# Altium footprint library mobinbyn-Header.PcbLib: 297 footprints (part 15 of 23)
Each footprint in its own frame and in the unit in brackets; x right, y up, seen from the top. Pads: shape width x height; smd on the part's side, far side on the other; paste and mask are expansions set on the pad; w line width, h text height; cw(c..) or ccw(c..) is an arc to the next point about the centre after c.
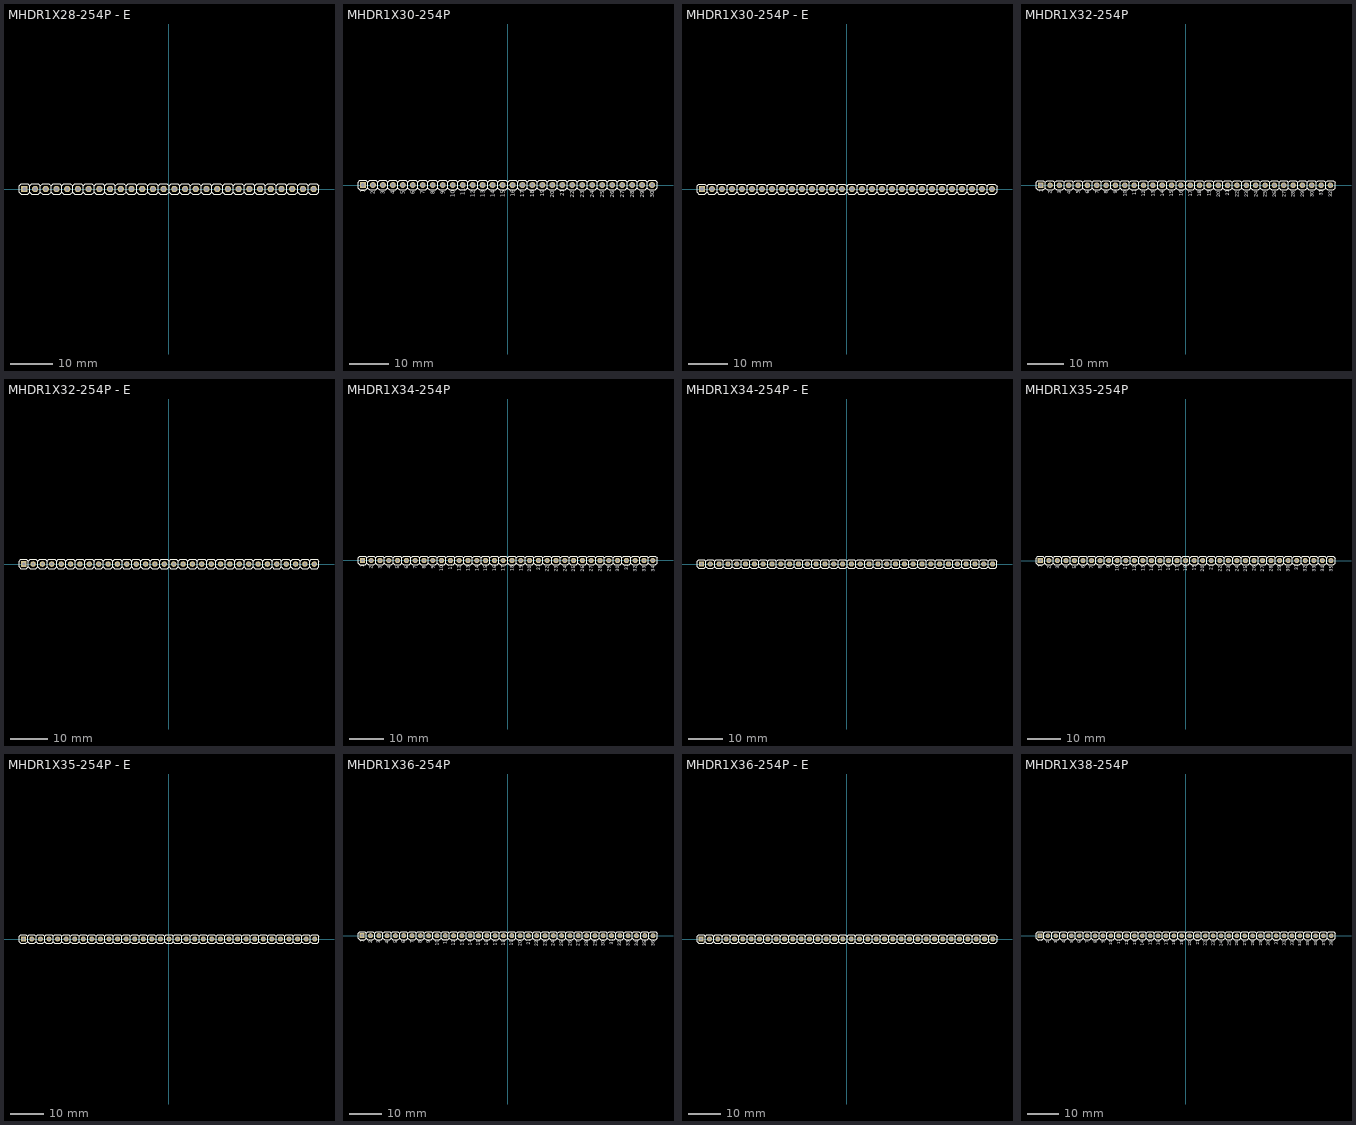
[diagram p14: the footprints below, top view; thin cyan lines are the x and y axes]

## MHDR1X28-254P - E [mm] "Male Header 1X28 with 2.54 mm Pitch"
height 8.4
pads (28):
  rect 1.5x1.5 hole 0.9: 1(-34.29,0)
  round 1.5 hole 0.9: 2(-31.75,0) 3(-29.21,0) 4(-26.67,0) 5(-24.13,0) 6(-21.59,0) 7(-19.05,0) 8(-16.51,0) 9(-13.97,0) 10(-11.43,0) 11(-8.89,0) 12(-6.35,0) 13(-3.81,0) 14(-1.27,0) 15(1.27,0) 16(3.81,0) 17(6.35,0) 18(8.89,0) 19(11.43,0) 20(13.97,0) 21(16.51,0) 22(19.05,0) 23(21.59,0) 24(24.13,0) 25(26.67,0) 26(29.21,0) 27(31.75,0) 28(34.29,0)
Top Overlay:
  drawing of 197 lines, arcs and shapes, not listed
3D body "PIN.STEP": height 8.43, standoff -2.49, extent -35.56,-1.27 -33.02,1.27
3D body "PIN_mid.STEP": height 8.43, standoff -2.49, extent -33.02,-1.27 -30.48,1.27
3D body "PIN_mid.STEP": height 8.43, standoff -2.49, extent -30.48,-1.27 -27.94,1.27
3D body "PIN_mid.STEP": height 8.43, standoff -2.49, extent -27.94,-1.27 -25.4,1.27
3D body "PIN_mid.STEP": height 8.43, standoff -2.49, extent -25.4,-1.27 -22.86,1.27
3D body "PIN_mid.STEP": height 8.43, standoff -2.49, extent -22.86,-1.27 -20.32,1.27
3D body "PIN_mid.STEP": height 8.43, standoff -2.49, extent -20.32,-1.27 -17.78,1.27
3D body "PIN_mid.STEP": height 8.43, standoff -2.49, extent -17.78,-1.27 -15.24,1.27
3D body "PIN_mid.STEP": height 8.43, standoff -2.49, extent -15.24,-1.27 -12.7,1.27
3D body "PIN_mid.STEP": height 8.43, standoff -2.49, extent -12.7,-1.27 -10.16,1.27
3D body "PIN_mid.STEP": height 8.43, standoff -2.49, extent -10.16,-1.27 -7.62,1.27
3D body "PIN_mid.STEP": height 8.43, standoff -2.49, extent -7.62,-1.27 -5.08,1.27
3D body "PIN_mid.STEP": height 8.43, standoff -2.49, extent -5.08,-1.27 -2.54,1.27
3D body "PIN_mid.STEP": height 8.43, standoff -2.49, extent -2.54,-1.27 0,1.27
3D body "PIN_mid.STEP": height 8.43, standoff -2.49, extent 0,-1.27 2.54,1.27
3D body "PIN_mid.STEP": height 8.43, standoff -2.49, extent 2.54,-1.27 5.08,1.27
3D body "PIN_mid.STEP": height 8.43, standoff -2.49, extent 5.08,-1.27 7.62,1.27
3D body "PIN_mid.STEP": height 8.43, standoff -2.49, extent 7.62,-1.27 10.16,1.27
3D body "PIN_mid.STEP": height 8.43, standoff -2.49, extent 10.16,-1.27 12.7,1.27
3D body "PIN_mid.STEP": height 8.43, standoff -2.49, extent 12.7,-1.27 15.24,1.27
3D body "PIN_mid.STEP": height 8.43, standoff -2.49, extent 15.24,-1.27 17.78,1.27
3D body "PIN_mid.STEP": height 8.43, standoff -2.49, extent 17.78,-1.27 20.32,1.27
3D body "PIN_mid.STEP": height 8.43, standoff -2.49, extent 20.32,-1.27 22.86,1.27
3D body "PIN_mid.STEP": height 8.43, standoff -2.49, extent 22.86,-1.27 25.4,1.27
3D body "PIN_mid.STEP": height 8.43, standoff -2.49, extent 25.4,-1.27 27.94,1.27
3D body "PIN_mid.STEP": height 8.43, standoff -2.49, extent 27.94,-1.27 30.48,1.27
3D body "PIN_mid.STEP": height 8.43, standoff -2.49, extent 30.48,-1.27 33.02,1.27
3D body "PIN.STEP": height 8.43, standoff -2.49, extent 33.02,-1.27 35.56,1.27

## MHDR1X30-254P [mm] "Male Header 1X30 with 2.54 mm Pitch"
height 8.4
pads (30):
  rect 1.5x1.5 hole 0.9: 1(-36.83,0)
  round 1.5 hole 0.9: 2(-34.29,0) 3(-31.75,0) 4(-29.21,0) 5(-26.67,0) 6(-24.13,0) 7(-21.59,0) 8(-19.05,0) 9(-16.51,0) 10(-13.97,0) 11(-11.43,0) 12(-8.89,0) 13(-6.35,0) 14(-3.81,0) 15(-1.27,0) 16(1.27,0) 17(3.81,0) 18(6.35,0) 19(8.89,0) 20(11.43,0) 21(13.97,0) 22(16.51,0) 23(19.05,0) 24(21.59,0) 25(24.13,0) 26(26.67,0) 27(29.21,0) 28(31.75,0) 29(34.29,0) 30(36.83,0)
Top Overlay:
  drawing of 211 lines, arcs and shapes, not listed
  text "1" at -36.322,-1.936 h1
  text "1" at -36.322,-1.936 h1
  text "2" at -33.782,-2.364 h1
  text "3" at -31.242,-2.364 h1
  text "4" at -28.702,-2.412 h1
  text "5" at -26.162,-2.364 h1
  text "6" at -23.622,-2.317 h1
  text "7" at -21.082,-2.364 h1
  text "8" at -18.542,-2.364 h1
  text "9" at -16.002,-2.317 h1
  text "10" at -13.462,-3.097 h1
  text "11" at -10.922,-2.669 h1
  text "12" at -8.382,-3.097 h1
  text "13" at -5.842,-3.097 h1
  text "14" at -3.302,-3.145 h1
  text "15" at -0.762,-3.097 h1
  text "16" at 1.778,-3.05 h1
  text "17" at 4.318,-3.097 h1
  text "18" at 6.858,-3.097 h1
  text "19" at 9.398,-3.05 h1
  text "20" at 11.938,-3.254 h1
  text "21" at 14.478,-2.826 h1
  text "22" at 17.018,-3.254 h1
  text "23" at 19.558,-3.254 h1
  text "24" at 22.098,-3.302 h1
  text "25" at 24.638,-3.254 h1
  text "26" at 27.178,-3.207 h1
  text "27" at 29.718,-3.254 h1
  text "28" at 32.258,-3.254 h1
  text "29" at 34.798,-3.207 h1
  text "30" at 37.338,-3.254 h1
3D body "PIN.STEP": height 8.43, standoff -2.49, extent 35.56,-1.27 38.1,1.27
3D body "PIN_mid.STEP": height 8.43, standoff -2.49, extent 33.02,-1.27 35.56,1.27
3D body "PIN_mid.STEP": height 8.43, standoff -2.49, extent 30.48,-1.27 33.02,1.27
3D body "PIN_mid.STEP": height 8.43, standoff -2.49, extent 27.94,-1.27 30.48,1.27
3D body "PIN_mid.STEP": height 8.43, standoff -2.49, extent 25.4,-1.27 27.94,1.27
3D body "PIN_mid.STEP": height 8.43, standoff -2.49, extent 22.86,-1.27 25.4,1.27
3D body "PIN_mid.STEP": height 8.43, standoff -2.49, extent 20.32,-1.27 22.86,1.27
3D body "PIN_mid.STEP": height 8.43, standoff -2.49, extent 17.78,-1.27 20.32,1.27
3D body "PIN_mid.STEP": height 8.43, standoff -2.49, extent 15.24,-1.27 17.78,1.27
3D body "PIN_mid.STEP": height 8.43, standoff -2.49, extent 12.7,-1.27 15.24,1.27
3D body "PIN_mid.STEP": height 8.43, standoff -2.49, extent 10.16,-1.27 12.7,1.27
3D body "PIN_mid.STEP": height 8.43, standoff -2.49, extent 7.62,-1.27 10.16,1.27
3D body "PIN_mid.STEP": height 8.43, standoff -2.49, extent 5.08,-1.27 7.62,1.27
3D body "PIN_mid.STEP": height 8.43, standoff -2.49, extent 2.54,-1.27 5.08,1.27
3D body "PIN_mid.STEP": height 8.43, standoff -2.49, extent 0,-1.27 2.54,1.27
3D body "PIN_mid.STEP": height 8.43, standoff -2.49, extent -2.54,-1.27 0,1.27
3D body "PIN_mid.STEP": height 8.43, standoff -2.49, extent -5.08,-1.27 -2.54,1.27
3D body "PIN_mid.STEP": height 8.43, standoff -2.49, extent -7.62,-1.27 -5.08,1.27
3D body "PIN_mid.STEP": height 8.43, standoff -2.49, extent -10.16,-1.27 -7.62,1.27
3D body "PIN_mid.STEP": height 8.43, standoff -2.49, extent -12.7,-1.27 -10.16,1.27
3D body "PIN_mid.STEP": height 8.43, standoff -2.49, extent -15.24,-1.27 -12.7,1.27
3D body "PIN_mid.STEP": height 8.43, standoff -2.49, extent -17.78,-1.27 -15.24,1.27
3D body "PIN_mid.STEP": height 8.43, standoff -2.49, extent -20.32,-1.27 -17.78,1.27
3D body "PIN_mid.STEP": height 8.43, standoff -2.49, extent -22.86,-1.27 -20.32,1.27
3D body "PIN_mid.STEP": height 8.43, standoff -2.49, extent -25.4,-1.27 -22.86,1.27
3D body "PIN_mid.STEP": height 8.43, standoff -2.49, extent -27.94,-1.27 -25.4,1.27
3D body "PIN_mid.STEP": height 8.43, standoff -2.49, extent -30.48,-1.27 -27.94,1.27
3D body "PIN_mid.STEP": height 8.43, standoff -2.49, extent -33.02,-1.27 -30.48,1.27
3D body "PIN_mid.STEP": height 8.43, standoff -2.49, extent -35.56,-1.27 -33.02,1.27
3D body "PIN.STEP": height 8.43, standoff -2.49, extent -38.1,-1.27 -35.56,1.27

## MHDR1X30-254P - E [mm] "Male Header 1X30 with 2.54 mm Pitch"
height 8.4
pads (30):
  rect 1.5x1.5 hole 0.9: 1(-36.83,0)
  round 1.5 hole 0.9: 2(-34.29,0) 3(-31.75,0) 4(-29.21,0) 5(-26.67,0) 6(-24.13,0) 7(-21.59,0) 8(-19.05,0) 9(-16.51,0) 10(-13.97,0) 11(-11.43,0) 12(-8.89,0) 13(-6.35,0) 14(-3.81,0) 15(-1.27,0) 16(1.27,0) 17(3.81,0) 18(6.35,0) 19(8.89,0) 20(11.43,0) 21(13.97,0) 22(16.51,0) 23(19.05,0) 24(21.59,0) 25(24.13,0) 26(26.67,0) 27(29.21,0) 28(31.75,0) 29(34.29,0) 30(36.83,0)
Top Overlay:
  drawing of 211 lines, arcs and shapes, not listed
3D body "PIN.STEP": height 8.43, standoff -2.49, extent 35.56,-1.27 38.1,1.27
3D body "PIN_mid.STEP": height 8.43, standoff -2.49, extent 33.02,-1.27 35.56,1.27
3D body "PIN_mid.STEP": height 8.43, standoff -2.49, extent 30.48,-1.27 33.02,1.27
3D body "PIN_mid.STEP": height 8.43, standoff -2.49, extent 27.94,-1.27 30.48,1.27
3D body "PIN_mid.STEP": height 8.43, standoff -2.49, extent 25.4,-1.27 27.94,1.27
3D body "PIN_mid.STEP": height 8.43, standoff -2.49, extent 22.86,-1.27 25.4,1.27
3D body "PIN_mid.STEP": height 8.43, standoff -2.49, extent 20.32,-1.27 22.86,1.27
3D body "PIN_mid.STEP": height 8.43, standoff -2.49, extent 17.78,-1.27 20.32,1.27
3D body "PIN_mid.STEP": height 8.43, standoff -2.49, extent 15.24,-1.27 17.78,1.27
3D body "PIN_mid.STEP": height 8.43, standoff -2.49, extent 12.7,-1.27 15.24,1.27
3D body "PIN_mid.STEP": height 8.43, standoff -2.49, extent 10.16,-1.27 12.7,1.27
3D body "PIN_mid.STEP": height 8.43, standoff -2.49, extent 7.62,-1.27 10.16,1.27
3D body "PIN_mid.STEP": height 8.43, standoff -2.49, extent 5.08,-1.27 7.62,1.27
3D body "PIN_mid.STEP": height 8.43, standoff -2.49, extent 2.54,-1.27 5.08,1.27
3D body "PIN_mid.STEP": height 8.43, standoff -2.49, extent 0,-1.27 2.54,1.27
3D body "PIN_mid.STEP": height 8.43, standoff -2.49, extent -2.54,-1.27 0,1.27
3D body "PIN_mid.STEP": height 8.43, standoff -2.49, extent -5.08,-1.27 -2.54,1.27
3D body "PIN_mid.STEP": height 8.43, standoff -2.49, extent -7.62,-1.27 -5.08,1.27
3D body "PIN_mid.STEP": height 8.43, standoff -2.49, extent -10.16,-1.27 -7.62,1.27
3D body "PIN_mid.STEP": height 8.43, standoff -2.49, extent -12.7,-1.27 -10.16,1.27
3D body "PIN_mid.STEP": height 8.43, standoff -2.49, extent -15.24,-1.27 -12.7,1.27
3D body "PIN_mid.STEP": height 8.43, standoff -2.49, extent -17.78,-1.27 -15.24,1.27
3D body "PIN_mid.STEP": height 8.43, standoff -2.49, extent -20.32,-1.27 -17.78,1.27
3D body "PIN_mid.STEP": height 8.43, standoff -2.49, extent -22.86,-1.27 -20.32,1.27
3D body "PIN_mid.STEP": height 8.43, standoff -2.49, extent -25.4,-1.27 -22.86,1.27
3D body "PIN_mid.STEP": height 8.43, standoff -2.49, extent -27.94,-1.27 -25.4,1.27
3D body "PIN_mid.STEP": height 8.43, standoff -2.49, extent -30.48,-1.27 -27.94,1.27
3D body "PIN_mid.STEP": height 8.43, standoff -2.49, extent -33.02,-1.27 -30.48,1.27
3D body "PIN_mid.STEP": height 8.43, standoff -2.49, extent -35.56,-1.27 -33.02,1.27
3D body "PIN.STEP": height 8.43, standoff -2.49, extent -38.1,-1.27 -35.56,1.27

## MHDR1X32-254P [mm] "Male Header 1X32 with 2.54 mm Pitch"
height 8.4
pads (32):
  rect 1.5x1.5 hole 0.9: 1(-39.37,0)
  round 1.5 hole 0.9: 2(-36.83,0) 3(-34.29,0) 4(-31.75,0) 5(-29.21,0) 6(-26.67,0) 7(-24.13,0) 8(-21.59,0) 9(-19.05,0) 10(-16.51,0) 11(-13.97,0) 12(-11.43,0) 13(-8.89,0) 14(-6.35,0) 15(-3.81,0) 16(-1.27,0) 17(1.27,0) 18(3.81,0) 19(6.35,0) 20(8.89,0) 21(11.43,0) 22(13.97,0) 23(16.51,0) 24(19.05,0) 25(21.59,0) 26(24.13,0) 27(26.67,0) 28(29.21,0) 29(31.75,0) 30(34.29,0) 31(36.83,0) 32(39.37,0)
Top Overlay:
  drawing of 225 lines, arcs and shapes, not listed
  text "1" at -38.862,-1.936 h1
  text "1" at -38.862,-1.936 h1
  text "2" at -36.322,-2.364 h1
  text "3" at -33.782,-2.364 h1
  text "4" at -31.242,-2.412 h1
  text "5" at -28.702,-2.364 h1
  text "6" at -26.162,-2.317 h1
  text "7" at -23.622,-2.364 h1
  text "8" at -21.082,-2.364 h1
  text "9" at -18.542,-2.317 h1
  text "10" at -16.002,-3.097 h1
  text "11" at -13.462,-2.669 h1
  text "12" at -10.922,-3.097 h1
  text "13" at -8.382,-3.097 h1
  text "14" at -5.842,-3.145 h1
  text "15" at -3.302,-3.097 h1
  text "16" at -0.762,-3.05 h1
  text "17" at 1.778,-3.097 h1
  text "18" at 4.318,-3.097 h1
  text "19" at 6.858,-3.05 h1
  text "20" at 9.398,-3.254 h1
  text "21" at 11.938,-2.826 h1
  text "22" at 14.478,-3.254 h1
  text "23" at 17.018,-3.254 h1
  text "24" at 19.558,-3.302 h1
  text "25" at 22.098,-3.254 h1
  text "26" at 24.638,-3.207 h1
  text "27" at 27.178,-3.254 h1
  text "28" at 29.718,-3.254 h1
  text "29" at 32.258,-3.207 h1
  text "30" at 34.798,-3.254 h1
  text "31" at 37.338,-2.826 h1
  text "32" at 39.878,-3.254 h1
3D body "PIN.STEP": height 8.43, standoff -2.49, extent -40.64,-1.27 -38.1,1.27
3D body "PIN_mid.STEP": height 8.43, standoff -2.49, extent -38.1,-1.27 -35.56,1.27
3D body "PIN_mid.STEP": height 8.43, standoff -2.49, extent -35.56,-1.27 -33.02,1.27
3D body "PIN_mid.STEP": height 8.43, standoff -2.49, extent -33.02,-1.27 -30.48,1.27
3D body "PIN_mid.STEP": height 8.43, standoff -2.49, extent -30.48,-1.27 -27.94,1.27
3D body "PIN_mid.STEP": height 8.43, standoff -2.49, extent -27.94,-1.27 -25.4,1.27
3D body "PIN_mid.STEP": height 8.43, standoff -2.49, extent -25.4,-1.27 -22.86,1.27
3D body "PIN_mid.STEP": height 8.43, standoff -2.49, extent -22.86,-1.27 -20.32,1.27
3D body "PIN_mid.STEP": height 8.43, standoff -2.49, extent -20.32,-1.27 -17.78,1.27
3D body "PIN_mid.STEP": height 8.43, standoff -2.49, extent -17.78,-1.27 -15.24,1.27
3D body "PIN_mid.STEP": height 8.43, standoff -2.49, extent -15.24,-1.27 -12.7,1.27
3D body "PIN_mid.STEP": height 8.43, standoff -2.49, extent -12.7,-1.27 -10.16,1.27
3D body "PIN_mid.STEP": height 8.43, standoff -2.49, extent -10.16,-1.27 -7.62,1.27
3D body "PIN_mid.STEP": height 8.43, standoff -2.49, extent -7.62,-1.27 -5.08,1.27
3D body "PIN_mid.STEP": height 8.43, standoff -2.49, extent -5.08,-1.27 -2.54,1.27
3D body "PIN_mid.STEP": height 8.43, standoff -2.49, extent -2.54,-1.27 0,1.27
3D body "PIN_mid.STEP": height 8.43, standoff -2.49, extent 0,-1.27 2.54,1.27
3D body "PIN_mid.STEP": height 8.43, standoff -2.49, extent 2.54,-1.27 5.08,1.27
3D body "PIN_mid.STEP": height 8.43, standoff -2.49, extent 5.08,-1.27 7.62,1.27
3D body "PIN_mid.STEP": height 8.43, standoff -2.49, extent 7.62,-1.27 10.16,1.27
3D body "PIN_mid.STEP": height 8.43, standoff -2.49, extent 10.16,-1.27 12.7,1.27
3D body "PIN_mid.STEP": height 8.43, standoff -2.49, extent 12.7,-1.27 15.24,1.27
3D body "PIN_mid.STEP": height 8.43, standoff -2.49, extent 15.24,-1.27 17.78,1.27
3D body "PIN_mid.STEP": height 8.43, standoff -2.49, extent 17.78,-1.27 20.32,1.27
3D body "PIN_mid.STEP": height 8.43, standoff -2.49, extent 20.32,-1.27 22.86,1.27
3D body "PIN_mid.STEP": height 8.43, standoff -2.49, extent 22.86,-1.27 25.4,1.27
3D body "PIN_mid.STEP": height 8.43, standoff -2.49, extent 25.4,-1.27 27.94,1.27
3D body "PIN_mid.STEP": height 8.43, standoff -2.49, extent 27.94,-1.27 30.48,1.27
3D body "PIN_mid.STEP": height 8.43, standoff -2.49, extent 30.48,-1.27 33.02,1.27
3D body "PIN_mid.STEP": height 8.43, standoff -2.49, extent 33.02,-1.27 35.56,1.27
3D body "PIN_mid.STEP": height 8.43, standoff -2.49, extent 35.56,-1.27 38.1,1.27
3D body "PIN.STEP": height 8.43, standoff -2.49, extent 38.1,-1.27 40.64,1.27

## MHDR1X32-254P - E [mm] "Male Header 1X32 with 2.54 mm Pitch"
height 8.4
pads (32):
  rect 1.5x1.5 hole 0.9: 1(-39.37,0)
  round 1.5 hole 0.9: 2(-36.83,0) 3(-34.29,0) 4(-31.75,0) 5(-29.21,0) 6(-26.67,0) 7(-24.13,0) 8(-21.59,0) 9(-19.05,0) 10(-16.51,0) 11(-13.97,0) 12(-11.43,0) 13(-8.89,0) 14(-6.35,0) 15(-3.81,0) 16(-1.27,0) 17(1.27,0) 18(3.81,0) 19(6.35,0) 20(8.89,0) 21(11.43,0) 22(13.97,0) 23(16.51,0) 24(19.05,0) 25(21.59,0) 26(24.13,0) 27(26.67,0) 28(29.21,0) 29(31.75,0) 30(34.29,0) 31(36.83,0) 32(39.37,0)
Top Overlay:
  drawing of 225 lines, arcs and shapes, not listed
3D body "PIN.STEP": height 8.43, standoff -2.49, extent 38.1,-1.27 40.64,1.27
3D body "PIN_mid.STEP": height 8.43, standoff -2.49, extent 35.56,-1.27 38.1,1.27
3D body "PIN_mid.STEP": height 8.43, standoff -2.49, extent 33.02,-1.27 35.56,1.27
3D body "PIN_mid.STEP": height 8.43, standoff -2.49, extent 30.48,-1.27 33.02,1.27
3D body "PIN_mid.STEP": height 8.43, standoff -2.49, extent 27.94,-1.27 30.48,1.27
3D body "PIN_mid.STEP": height 8.43, standoff -2.49, extent 25.4,-1.27 27.94,1.27
3D body "PIN_mid.STEP": height 8.43, standoff -2.49, extent 22.86,-1.27 25.4,1.27
3D body "PIN_mid.STEP": height 8.43, standoff -2.49, extent 20.32,-1.27 22.86,1.27
3D body "PIN_mid.STEP": height 8.43, standoff -2.49, extent 17.78,-1.27 20.32,1.27
3D body "PIN_mid.STEP": height 8.43, standoff -2.49, extent 15.24,-1.27 17.78,1.27
3D body "PIN_mid.STEP": height 8.43, standoff -2.49, extent 12.7,-1.27 15.24,1.27
3D body "PIN_mid.STEP": height 8.43, standoff -2.49, extent 10.16,-1.27 12.7,1.27
3D body "PIN_mid.STEP": height 8.43, standoff -2.49, extent 7.62,-1.27 10.16,1.27
3D body "PIN_mid.STEP": height 8.43, standoff -2.49, extent 5.08,-1.27 7.62,1.27
3D body "PIN_mid.STEP": height 8.43, standoff -2.49, extent 2.54,-1.27 5.08,1.27
3D body "PIN_mid.STEP": height 8.43, standoff -2.49, extent 0,-1.27 2.54,1.27
3D body "PIN_mid.STEP": height 8.43, standoff -2.49, extent -2.54,-1.27 0,1.27
3D body "PIN_mid.STEP": height 8.43, standoff -2.49, extent -5.08,-1.27 -2.54,1.27
3D body "PIN_mid.STEP": height 8.43, standoff -2.49, extent -7.62,-1.27 -5.08,1.27
3D body "PIN_mid.STEP": height 8.43, standoff -2.49, extent -10.16,-1.27 -7.62,1.27
3D body "PIN_mid.STEP": height 8.43, standoff -2.49, extent -12.7,-1.27 -10.16,1.27
3D body "PIN_mid.STEP": height 8.43, standoff -2.49, extent -15.24,-1.27 -12.7,1.27
3D body "PIN_mid.STEP": height 8.43, standoff -2.49, extent -17.78,-1.27 -15.24,1.27
3D body "PIN_mid.STEP": height 8.43, standoff -2.49, extent -20.32,-1.27 -17.78,1.27
3D body "PIN_mid.STEP": height 8.43, standoff -2.49, extent -22.86,-1.27 -20.32,1.27
3D body "PIN_mid.STEP": height 8.43, standoff -2.49, extent -25.4,-1.27 -22.86,1.27
3D body "PIN_mid.STEP": height 8.43, standoff -2.49, extent -27.94,-1.27 -25.4,1.27
3D body "PIN_mid.STEP": height 8.43, standoff -2.49, extent -30.48,-1.27 -27.94,1.27
3D body "PIN_mid.STEP": height 8.43, standoff -2.49, extent -33.02,-1.27 -30.48,1.27
3D body "PIN_mid.STEP": height 8.43, standoff -2.49, extent -35.56,-1.27 -33.02,1.27
3D body "PIN_mid.STEP": height 8.43, standoff -2.49, extent -38.1,-1.27 -35.56,1.27
3D body "PIN.STEP": height 8.43, standoff -2.49, extent -40.64,-1.27 -38.1,1.27

## MHDR1X34-254P [mm] "Male Header 1X34 with 2.54 mm Pitch"
pads (34):
  rect 1.5x1.5 hole 0.9: 1(-41.91,0)
  round 1.5 hole 0.9: 2(-39.37,0) 3(-36.83,0) 4(-34.29,0) 5(-31.75,0) 6(-29.21,0) 7(-26.67,0) 8(-24.13,0) 9(-21.59,0) 10(-19.05,0) 11(-16.51,0) 12(-13.97,0) 13(-11.43,0) 14(-8.89,0) 15(-6.35,0) 16(-3.81,0) 17(-1.27,0) 18(1.27,0) 19(3.81,0) 20(6.35,0) 21(8.89,0) 22(11.43,0) 23(13.97,0) 24(16.51,0) 25(19.05,0) 26(21.59,0) 27(24.13,0) 28(26.67,0) 29(29.21,0) 30(31.75,0) 31(34.29,0) 32(36.83,0) 33(39.37,0) 34(41.91,0)
Top Overlay:
  drawing of 239 lines, arcs and shapes, not listed
  text "34" at 42.418,-3.302 h1
  text "33" at 39.878,-3.254 h1
  text "32" at 37.338,-3.254 h1
  text "31" at 34.798,-2.826 h1
  text "30" at 32.258,-3.254 h1
  text "29" at 29.718,-3.207 h1
  text "28" at 27.178,-3.254 h1
  text "27" at 24.638,-3.254 h1
  text "26" at 22.098,-3.207 h1
  text "25" at 19.558,-3.254 h1
  text "24" at 17.018,-3.302 h1
  text "23" at 14.478,-3.254 h1
  text "22" at 11.938,-3.254 h1
  text "21" at 9.398,-2.826 h1
  text "20" at 6.858,-3.254 h1
  text "19" at 4.318,-3.05 h1
  text "18" at 1.778,-3.097 h1
  text "17" at -0.762,-3.097 h1
  text "16" at -3.302,-3.05 h1
  text "15" at -5.842,-3.097 h1
  text "14" at -8.382,-3.145 h1
  text "13" at -10.922,-3.097 h1
  text "12" at -13.462,-3.097 h1
  text "11" at -16.002,-2.669 h1
  text "10" at -18.542,-3.097 h1
  text "9" at -21.082,-2.317 h1
  text "8" at -23.622,-2.364 h1
  text "7" at -26.162,-2.364 h1
  text "6" at -28.702,-2.317 h1
  text "5" at -31.242,-2.364 h1
  text "4" at -33.782,-2.412 h1
  text "3" at -36.322,-2.364 h1
  text "2" at -38.862,-2.364 h1
  text "1" at -41.402,-1.936 h1
  text "1" at -41.402,-1.936 h1
3D body "PIN.STEP": height 8.43, standoff -2.49, extent -43.18,-1.27 -40.64,1.27
3D body "PIN_mid.STEP": height 8.43, standoff -2.49, extent -40.64,-1.27 -38.1,1.27
3D body "PIN_mid.STEP": height 8.43, standoff -2.49, extent -38.1,-1.27 -35.56,1.27
3D body "PIN_mid.STEP": height 8.43, standoff -2.49, extent -35.56,-1.27 -33.02,1.27
3D body "PIN_mid.STEP": height 8.43, standoff -2.49, extent -33.02,-1.27 -30.48,1.27
3D body "PIN_mid.STEP": height 8.43, standoff -2.49, extent -30.48,-1.27 -27.94,1.27
3D body "PIN_mid.STEP": height 8.43, standoff -2.49, extent -27.94,-1.27 -25.4,1.27
3D body "PIN_mid.STEP": height 8.43, standoff -2.49, extent -25.4,-1.27 -22.86,1.27
3D body "PIN_mid.STEP": height 8.43, standoff -2.49, extent -22.86,-1.27 -20.32,1.27
3D body "PIN_mid.STEP": height 8.43, standoff -2.49, extent -20.32,-1.27 -17.78,1.27
3D body "PIN_mid.STEP": height 8.43, standoff -2.49, extent -17.78,-1.27 -15.24,1.27
3D body "PIN_mid.STEP": height 8.43, standoff -2.49, extent -15.24,-1.27 -12.7,1.27
3D body "PIN_mid.STEP": height 8.43, standoff -2.49, extent -12.7,-1.27 -10.16,1.27
3D body "PIN_mid.STEP": height 8.43, standoff -2.49, extent -10.16,-1.27 -7.62,1.27
3D body "PIN_mid.STEP": height 8.43, standoff -2.49, extent -7.62,-1.27 -5.08,1.27
3D body "PIN_mid.STEP": height 8.43, standoff -2.49, extent -5.08,-1.27 -2.54,1.27
3D body "PIN_mid.STEP": height 8.43, standoff -2.49, extent -2.54,-1.27 0,1.27
3D body "PIN_mid.STEP": height 8.43, standoff -2.49, extent 0,-1.27 2.54,1.27
3D body "PIN_mid.STEP": height 8.43, standoff -2.49, extent 2.54,-1.27 5.08,1.27
3D body "PIN_mid.STEP": height 8.43, standoff -2.49, extent 5.08,-1.27 7.62,1.27
3D body "PIN_mid.STEP": height 8.43, standoff -2.49, extent 7.62,-1.27 10.16,1.27
3D body "PIN_mid.STEP": height 8.43, standoff -2.49, extent 10.16,-1.27 12.7,1.27
3D body "PIN_mid.STEP": height 8.43, standoff -2.49, extent 12.7,-1.27 15.24,1.27
3D body "PIN_mid.STEP": height 8.43, standoff -2.49, extent 15.24,-1.27 17.78,1.27
3D body "PIN_mid.STEP": height 8.43, standoff -2.49, extent 17.78,-1.27 20.32,1.27
3D body "PIN_mid.STEP": height 8.43, standoff -2.49, extent 20.32,-1.27 22.86,1.27
3D body "PIN_mid.STEP": height 8.43, standoff -2.49, extent 22.86,-1.27 25.4,1.27
3D body "PIN_mid.STEP": height 8.43, standoff -2.49, extent 25.4,-1.27 27.94,1.27
3D body "PIN_mid.STEP": height 8.43, standoff -2.49, extent 27.94,-1.27 30.48,1.27
3D body "PIN_mid.STEP": height 8.43, standoff -2.49, extent 30.48,-1.27 33.02,1.27
3D body "PIN_mid.STEP": height 8.43, standoff -2.49, extent 33.02,-1.27 35.56,1.27
3D body "PIN_mid.STEP": height 8.43, standoff -2.49, extent 35.56,-1.27 38.1,1.27
3D body "PIN_mid.STEP": height 8.43, standoff -2.49, extent 38.1,-1.27 40.64,1.27
3D body "PIN.STEP": height 8.43, standoff -2.49, extent 40.64,-1.27 43.18,1.27

## MHDR1X34-254P - E [mm] "Male Header 1X34 with 2.54 mm Pitch"
pads (34):
  rect 1.5x1.5 hole 0.9: 1(-41.91,0)
  round 1.5 hole 0.9: 2(-39.37,0) 3(-36.83,0) 4(-34.29,0) 5(-31.75,0) 6(-29.21,0) 7(-26.67,0) 8(-24.13,0) 9(-21.59,0) 10(-19.05,0) 11(-16.51,0) 12(-13.97,0) 13(-11.43,0) 14(-8.89,0) 15(-6.35,0) 16(-3.81,0) 17(-1.27,0) 18(1.27,0) 19(3.81,0) 20(6.35,0) 21(8.89,0) 22(11.43,0) 23(13.97,0) 24(16.51,0) 25(19.05,0) 26(21.59,0) 27(24.13,0) 28(26.67,0) 29(29.21,0) 30(31.75,0) 31(34.29,0) 32(36.83,0) 33(39.37,0) 34(41.91,0)
Top Overlay:
  drawing of 239 lines, arcs and shapes, not listed
3D body "PIN.STEP": height 8.43, standoff -2.49, extent -43.18,-1.27 -40.64,1.27
3D body "PIN_mid.STEP": height 8.43, standoff -2.49, extent -40.64,-1.27 -38.1,1.27
3D body "PIN_mid.STEP": height 8.43, standoff -2.49, extent -38.1,-1.27 -35.56,1.27
3D body "PIN_mid.STEP": height 8.43, standoff -2.49, extent -35.56,-1.27 -33.02,1.27
3D body "PIN_mid.STEP": height 8.43, standoff -2.49, extent -33.02,-1.27 -30.48,1.27
3D body "PIN_mid.STEP": height 8.43, standoff -2.49, extent -30.48,-1.27 -27.94,1.27
3D body "PIN_mid.STEP": height 8.43, standoff -2.49, extent -27.94,-1.27 -25.4,1.27
3D body "PIN_mid.STEP": height 8.43, standoff -2.49, extent -25.4,-1.27 -22.86,1.27
3D body "PIN_mid.STEP": height 8.43, standoff -2.49, extent -22.86,-1.27 -20.32,1.27
3D body "PIN_mid.STEP": height 8.43, standoff -2.49, extent -20.32,-1.27 -17.78,1.27
3D body "PIN_mid.STEP": height 8.43, standoff -2.49, extent -17.78,-1.27 -15.24,1.27
3D body "PIN_mid.STEP": height 8.43, standoff -2.49, extent -15.24,-1.27 -12.7,1.27
3D body "PIN_mid.STEP": height 8.43, standoff -2.49, extent -12.7,-1.27 -10.16,1.27
3D body "PIN_mid.STEP": height 8.43, standoff -2.49, extent -10.16,-1.27 -7.62,1.27
3D body "PIN_mid.STEP": height 8.43, standoff -2.49, extent -7.62,-1.27 -5.08,1.27
3D body "PIN_mid.STEP": height 8.43, standoff -2.49, extent -5.08,-1.27 -2.54,1.27
3D body "PIN_mid.STEP": height 8.43, standoff -2.49, extent -2.54,-1.27 0,1.27
3D body "PIN_mid.STEP": height 8.43, standoff -2.49, extent 0,-1.27 2.54,1.27
3D body "PIN_mid.STEP": height 8.43, standoff -2.49, extent 2.54,-1.27 5.08,1.27
3D body "PIN_mid.STEP": height 8.43, standoff -2.49, extent 5.08,-1.27 7.62,1.27
3D body "PIN_mid.STEP": height 8.43, standoff -2.49, extent 7.62,-1.27 10.16,1.27
3D body "PIN_mid.STEP": height 8.43, standoff -2.49, extent 10.16,-1.27 12.7,1.27
3D body "PIN_mid.STEP": height 8.43, standoff -2.49, extent 12.7,-1.27 15.24,1.27
3D body "PIN_mid.STEP": height 8.43, standoff -2.49, extent 15.24,-1.27 17.78,1.27
3D body "PIN_mid.STEP": height 8.43, standoff -2.49, extent 17.78,-1.27 20.32,1.27
3D body "PIN_mid.STEP": height 8.43, standoff -2.49, extent 20.32,-1.27 22.86,1.27
3D body "PIN_mid.STEP": height 8.43, standoff -2.49, extent 22.86,-1.27 25.4,1.27
3D body "PIN_mid.STEP": height 8.43, standoff -2.49, extent 25.4,-1.27 27.94,1.27
3D body "PIN_mid.STEP": height 8.43, standoff -2.49, extent 27.94,-1.27 30.48,1.27
3D body "PIN_mid.STEP": height 8.43, standoff -2.49, extent 30.48,-1.27 33.02,1.27
3D body "PIN_mid.STEP": height 8.43, standoff -2.49, extent 33.02,-1.27 35.56,1.27
3D body "PIN_mid.STEP": height 8.43, standoff -2.49, extent 35.56,-1.27 38.1,1.27
3D body "PIN_mid.STEP": height 8.43, standoff -2.49, extent 38.1,-1.27 40.64,1.27
3D body "PIN.STEP": height 8.43, standoff -2.49, extent 40.64,-1.27 43.18,1.27

## MHDR1X35-254P [mm] "Male Header 1X35 with 2.54 mm Pitch"
pads (35):
  rect 1.5x1.5 hole 0.9: 1(-43.18,0)
  round 1.5 hole 0.9: 2(-40.64,0) 3(-38.1,0) 4(-35.56,0) 5(-33.02,0) 6(-30.48,0) 7(-27.94,0) 8(-25.4,0) 9(-22.86,0) 10(-20.32,0) 11(-17.78,0) 12(-15.24,0) 13(-12.7,0) 14(-10.16,0) 15(-7.62,0) 16(-5.08,0) 17(-2.54,0) 18(0,0) 19(2.54,0) 20(5.08,0) 21(7.62,0) 22(10.16,0) 23(12.7,0) 24(15.24,0) 25(17.78,0) 26(20.32,0) 27(22.86,0) 28(25.4,0) 29(27.94,0) 30(30.48,0) 31(33.02,0) 32(35.56,0) 33(38.1,0) 34(40.64,0) 35(43.18,0)
Top Overlay:
  drawing of 246 lines, arcs and shapes, not listed
  text "1" at -42.672,-1.936 h1
  text "1" at -42.672,-1.936 h1
  text "2" at -40.132,-2.364 h1
  text "3" at -37.592,-2.364 h1
  text "4" at -35.052,-2.412 h1
  text "5" at -32.512,-2.364 h1
  text "6" at -29.972,-2.317 h1
  text "7" at -27.432,-2.364 h1
  text "8" at -24.892,-2.364 h1
  text "9" at -22.352,-2.317 h1
  text "10" at -19.812,-3.097 h1
  text "11" at -17.272,-2.669 h1
  text "12" at -14.732,-3.097 h1
  text "13" at -12.192,-3.097 h1
  text "14" at -9.652,-3.145 h1
  text "15" at -7.112,-3.097 h1
  text "16" at -4.572,-3.05 h1
  text "17" at -2.032,-3.097 h1
  text "18" at 0.508,-3.097 h1
  text "19" at 3.048,-3.05 h1
  text "20" at 5.588,-3.254 h1
  text "21" at 8.128,-2.826 h1
  text "22" at 10.668,-3.254 h1
  text "23" at 13.208,-3.254 h1
  text "24" at 15.748,-3.302 h1
  text "25" at 18.288,-3.254 h1
  text "26" at 20.828,-3.207 h1
  text "27" at 23.368,-3.254 h1
  text "28" at 25.908,-3.254 h1
  text "29" at 28.448,-3.207 h1
  text "30" at 30.988,-3.254 h1
  text "31" at 33.528,-2.826 h1
  text "32" at 36.068,-3.254 h1
  text "33" at 38.608,-3.254 h1
  text "34" at 41.148,-3.302 h1
  text "35" at 43.688,-3.254 h1
3D body "PIN.STEP": height 8.43, standoff -2.49, extent -44.45,-1.27 -41.91,1.27
3D body "PIN_mid.STEP": height 8.43, standoff -2.49, extent -41.91,-1.27 -39.37,1.27
3D body "PIN_mid.STEP": height 8.43, standoff -2.49, extent -39.37,-1.27 -36.83,1.27
3D body "PIN_mid.STEP": height 8.43, standoff -2.49, extent -36.83,-1.27 -34.29,1.27
3D body "PIN_mid.STEP": height 8.43, standoff -2.49, extent -34.29,-1.27 -31.75,1.27
3D body "PIN_mid.STEP": height 8.43, standoff -2.49, extent -31.75,-1.27 -29.21,1.27
3D body "PIN_mid.STEP": height 8.43, standoff -2.49, extent -29.21,-1.27 -26.67,1.27
3D body "PIN_mid.STEP": height 8.43, standoff -2.49, extent -26.67,-1.27 -24.13,1.27
3D body "PIN_mid.STEP": height 8.43, standoff -2.49, extent -24.13,-1.27 -21.59,1.27
3D body "PIN_mid.STEP": height 8.43, standoff -2.49, extent -21.59,-1.27 -19.05,1.27
3D body "PIN_mid.STEP": height 8.43, standoff -2.49, extent -19.05,-1.27 -16.51,1.27
3D body "PIN_mid.STEP": height 8.43, standoff -2.49, extent -16.51,-1.27 -13.97,1.27
3D body "PIN_mid.STEP": height 8.43, standoff -2.49, extent -13.97,-1.27 -11.43,1.27
3D body "PIN_mid.STEP": height 8.43, standoff -2.49, extent -11.43,-1.27 -8.89,1.27
3D body "PIN_mid.STEP": height 8.43, standoff -2.49, extent -8.89,-1.27 -6.35,1.27
3D body "PIN_mid.STEP": height 8.43, standoff -2.49, extent -6.35,-1.27 -3.81,1.27
3D body "PIN_mid.STEP": height 8.43, standoff -2.49, extent -3.81,-1.27 -1.27,1.27
3D body "PIN_mid.STEP": height 8.43, standoff -2.49, extent -1.27,-1.27 1.27,1.27
3D body "PIN_mid.STEP": height 8.43, standoff -2.49, extent 1.27,-1.27 3.81,1.27
3D body "PIN_mid.STEP": height 8.43, standoff -2.49, extent 3.81,-1.27 6.35,1.27
3D body "PIN_mid.STEP": height 8.43, standoff -2.49, extent 6.35,-1.27 8.89,1.27
3D body "PIN_mid.STEP": height 8.43, standoff -2.49, extent 8.89,-1.27 11.43,1.27
3D body "PIN_mid.STEP": height 8.43, standoff -2.49, extent 11.43,-1.27 13.97,1.27
3D body "PIN_mid.STEP": height 8.43, standoff -2.49, extent 13.97,-1.27 16.51,1.27
3D body "PIN_mid.STEP": height 8.43, standoff -2.49, extent 16.51,-1.27 19.05,1.27
3D body "PIN_mid.STEP": height 8.43, standoff -2.49, extent 19.05,-1.27 21.59,1.27
3D body "PIN_mid.STEP": height 8.43, standoff -2.49, extent 21.59,-1.27 24.13,1.27
3D body "PIN_mid.STEP": height 8.43, standoff -2.49, extent 24.13,-1.27 26.67,1.27
3D body "PIN_mid.STEP": height 8.43, standoff -2.49, extent 26.67,-1.27 29.21,1.27
3D body "PIN_mid.STEP": height 8.43, standoff -2.49, extent 29.21,-1.27 31.75,1.27
3D body "PIN_mid.STEP": height 8.43, standoff -2.49, extent 31.75,-1.27 34.29,1.27
3D body "PIN_mid.STEP": height 8.43, standoff -2.49, extent 34.29,-1.27 36.83,1.27
3D body "PIN_mid.STEP": height 8.43, standoff -2.49, extent 36.83,-1.27 39.37,1.27
3D body "PIN_mid.STEP": height 8.43, standoff -2.49, extent 39.37,-1.27 41.91,1.27
3D body "PIN.STEP": height 8.43, standoff -2.49, extent 41.91,-1.27 44.45,1.27

## MHDR1X35-254P - E [mm] "Male Header 1X35 with 2.54 mm Pitch"
pads (35):
  rect 1.5x1.5 hole 0.9: 1(-43.18,0)
  round 1.5 hole 0.9: 2(-40.64,0) 3(-38.1,0) 4(-35.56,0) 5(-33.02,0) 6(-30.48,0) 7(-27.94,0) 8(-25.4,0) 9(-22.86,0) 10(-20.32,0) 11(-17.78,0) 12(-15.24,0) 13(-12.7,0) 14(-10.16,0) 15(-7.62,0) 16(-5.08,0) 17(-2.54,0) 18(0,0) 19(2.54,0) 20(5.08,0) 21(7.62,0) 22(10.16,0) 23(12.7,0) 24(15.24,0) 25(17.78,0) 26(20.32,0) 27(22.86,0) 28(25.4,0) 29(27.94,0) 30(30.48,0) 31(33.02,0) 32(35.56,0) 33(38.1,0) 34(40.64,0) 35(43.18,0)
Top Overlay:
  drawing of 246 lines, arcs and shapes, not listed
3D body "PIN.STEP": height 8.43, standoff -2.49, extent 41.91,-1.27 44.45,1.27
3D body "PIN_mid.STEP": height 8.43, standoff -2.49, extent 39.37,-1.27 41.91,1.27
3D body "PIN_mid.STEP": height 8.43, standoff -2.49, extent 36.83,-1.27 39.37,1.27
3D body "PIN_mid.STEP": height 8.43, standoff -2.49, extent 34.29,-1.27 36.83,1.27
3D body "PIN_mid.STEP": height 8.43, standoff -2.49, extent 31.75,-1.27 34.29,1.27
3D body "PIN_mid.STEP": height 8.43, standoff -2.49, extent 29.21,-1.27 31.75,1.27
3D body "PIN_mid.STEP": height 8.43, standoff -2.49, extent 26.67,-1.27 29.21,1.27
3D body "PIN_mid.STEP": height 8.43, standoff -2.49, extent 24.13,-1.27 26.67,1.27
3D body "PIN_mid.STEP": height 8.43, standoff -2.49, extent 21.59,-1.27 24.13,1.27
3D body "PIN_mid.STEP": height 8.43, standoff -2.49, extent 19.05,-1.27 21.59,1.27
3D body "PIN_mid.STEP": height 8.43, standoff -2.49, extent 16.51,-1.27 19.05,1.27
3D body "PIN_mid.STEP": height 8.43, standoff -2.49, extent 13.97,-1.27 16.51,1.27
3D body "PIN_mid.STEP": height 8.43, standoff -2.49, extent 11.43,-1.27 13.97,1.27
3D body "PIN_mid.STEP": height 8.43, standoff -2.49, extent 8.89,-1.27 11.43,1.27
3D body "PIN_mid.STEP": height 8.43, standoff -2.49, extent 6.35,-1.27 8.89,1.27
3D body "PIN_mid.STEP": height 8.43, standoff -2.49, extent 3.81,-1.27 6.35,1.27
3D body "PIN_mid.STEP": height 8.43, standoff -2.49, extent 1.27,-1.27 3.81,1.27
3D body "PIN_mid.STEP": height 8.43, standoff -2.49, extent -1.27,-1.27 1.27,1.27
3D body "PIN_mid.STEP": height 8.43, standoff -2.49, extent -3.81,-1.27 -1.27,1.27
3D body "PIN_mid.STEP": height 8.43, standoff -2.49, extent -6.35,-1.27 -3.81,1.27
3D body "PIN_mid.STEP": height 8.43, standoff -2.49, extent -8.89,-1.27 -6.35,1.27
3D body "PIN_mid.STEP": height 8.43, standoff -2.49, extent -11.43,-1.27 -8.89,1.27
3D body "PIN_mid.STEP": height 8.43, standoff -2.49, extent -13.97,-1.27 -11.43,1.27
3D body "PIN_mid.STEP": height 8.43, standoff -2.49, extent -16.51,-1.27 -13.97,1.27
3D body "PIN_mid.STEP": height 8.43, standoff -2.49, extent -19.05,-1.27 -16.51,1.27
3D body "PIN_mid.STEP": height 8.43, standoff -2.49, extent -21.59,-1.27 -19.05,1.27
3D body "PIN_mid.STEP": height 8.43, standoff -2.49, extent -24.13,-1.27 -21.59,1.27
3D body "PIN_mid.STEP": height 8.43, standoff -2.49, extent -26.67,-1.27 -24.13,1.27
3D body "PIN_mid.STEP": height 8.43, standoff -2.49, extent -29.21,-1.27 -26.67,1.27
3D body "PIN_mid.STEP": height 8.43, standoff -2.49, extent -31.75,-1.27 -29.21,1.27
3D body "PIN_mid.STEP": height 8.43, standoff -2.49, extent -34.29,-1.27 -31.75,1.27
3D body "PIN_mid.STEP": height 8.43, standoff -2.49, extent -36.83,-1.27 -34.29,1.27
3D body "PIN_mid.STEP": height 8.43, standoff -2.49, extent -39.37,-1.27 -36.83,1.27
3D body "PIN_mid.STEP": height 8.43, standoff -2.49, extent -41.91,-1.27 -39.37,1.27
3D body "PIN.STEP": height 8.43, standoff -2.49, extent -44.45,-1.27 -41.91,1.27

## MHDR1X36-254P [mm] "Male Header 1X36 with 2.54 mm Pitch"
pads (36):
  rect 1.5x1.5 hole 0.9: 1(-44.45,0)
  round 1.5 hole 0.9: 2(-41.91,0) 3(-39.37,0) 4(-36.83,0) 5(-34.29,0) 6(-31.75,0) 7(-29.21,0) 8(-26.67,0) 9(-24.13,0) 10(-21.59,0) 11(-19.05,0) 12(-16.51,0) 13(-13.97,0) 14(-11.43,0) 15(-8.89,0) 16(-6.35,0) 17(-3.81,0) 18(-1.27,0) 19(1.27,0) 20(3.81,0) 21(6.35,0) 22(8.89,0) 23(11.43,0) 24(13.97,0) 25(16.51,0) 26(19.05,0) 27(21.59,0) 28(24.13,0) 29(26.67,0) 30(29.21,0) 31(31.75,0) 32(34.29,0) 33(36.83,0) 34(39.37,0) 35(41.91,0) 36(44.45,0)
Top Overlay:
  drawing of 253 lines, arcs and shapes, not listed
  text "1" at -43.942,-1.936 h1
  text "1" at -43.942,-1.936 h1
  text "2" at -41.402,-2.364 h1
  text "3" at -38.862,-2.364 h1
  text "4" at -36.322,-2.412 h1
  text "5" at -33.782,-2.364 h1
  text "6" at -31.242,-2.317 h1
  text "7" at -28.702,-2.364 h1
  text "8" at -26.162,-2.364 h1
  text "9" at -23.622,-2.317 h1
  text "10" at -21.082,-3.097 h1
  text "11" at -18.542,-2.669 h1
  text "12" at -16.002,-3.097 h1
  text "13" at -13.462,-3.097 h1
  text "14" at -10.922,-3.145 h1
  text "15" at -8.382,-3.097 h1
  text "16" at -5.842,-3.05 h1
  text "17" at -3.302,-3.097 h1
  text "18" at -0.762,-3.097 h1
  text "19" at 1.778,-3.05 h1
  text "20" at 4.318,-3.254 h1
  text "21" at 6.858,-2.826 h1
  text "22" at 9.398,-3.254 h1
  text "23" at 11.938,-3.254 h1
  text "24" at 14.478,-3.302 h1
  text "25" at 17.018,-3.254 h1
  text "26" at 19.558,-3.207 h1
  text "27" at 22.098,-3.254 h1
  text "28" at 24.638,-3.254 h1
  text "29" at 27.178,-3.207 h1
  text "30" at 29.718,-3.254 h1
  text "31" at 32.258,-2.826 h1
  text "32" at 34.798,-3.254 h1
  text "33" at 37.338,-3.254 h1
  text "34" at 39.878,-3.302 h1
  text "35" at 42.418,-3.254 h1
  text "36" at 44.958,-3.207 h1
3D body "PIN.STEP": height 8.43, standoff -2.49, extent 43.18,-1.27 45.72,1.27
3D body "PIN_mid.STEP": height 8.43, standoff -2.49, extent 40.64,-1.27 43.18,1.27
3D body "PIN_mid.STEP": height 8.43, standoff -2.49, extent 38.1,-1.27 40.64,1.27
3D body "PIN_mid.STEP": height 8.43, standoff -2.49, extent 35.56,-1.27 38.1,1.27
3D body "PIN_mid.STEP": height 8.43, standoff -2.49, extent 33.02,-1.27 35.56,1.27
3D body "PIN_mid.STEP": height 8.43, standoff -2.49, extent 30.48,-1.27 33.02,1.27
3D body "PIN_mid.STEP": height 8.43, standoff -2.49, extent 27.94,-1.27 30.48,1.27
3D body "PIN_mid.STEP": height 8.43, standoff -2.49, extent 25.4,-1.27 27.94,1.27
3D body "PIN_mid.STEP": height 8.43, standoff -2.49, extent 22.86,-1.27 25.4,1.27
3D body "PIN_mid.STEP": height 8.43, standoff -2.49, extent 20.32,-1.27 22.86,1.27
3D body "PIN_mid.STEP": height 8.43, standoff -2.49, extent 17.78,-1.27 20.32,1.27
3D body "PIN_mid.STEP": height 8.43, standoff -2.49, extent 15.24,-1.27 17.78,1.27
3D body "PIN_mid.STEP": height 8.43, standoff -2.49, extent 12.7,-1.27 15.24,1.27
3D body "PIN_mid.STEP": height 8.43, standoff -2.49, extent 10.16,-1.27 12.7,1.27
3D body "PIN_mid.STEP": height 8.43, standoff -2.49, extent 7.62,-1.27 10.16,1.27
3D body "PIN_mid.STEP": height 8.43, standoff -2.49, extent 5.08,-1.27 7.62,1.27
3D body "PIN_mid.STEP": height 8.43, standoff -2.49, extent 2.54,-1.27 5.08,1.27
3D body "PIN_mid.STEP": height 8.43, standoff -2.49, extent 0,-1.27 2.54,1.27
3D body "PIN_mid.STEP": height 8.43, standoff -2.49, extent -2.54,-1.27 0,1.27
3D body "PIN_mid.STEP": height 8.43, standoff -2.49, extent -5.08,-1.27 -2.54,1.27
3D body "PIN_mid.STEP": height 8.43, standoff -2.49, extent -7.62,-1.27 -5.08,1.27
3D body "PIN_mid.STEP": height 8.43, standoff -2.49, extent -10.16,-1.27 -7.62,1.27
3D body "PIN_mid.STEP": height 8.43, standoff -2.49, extent -12.7,-1.27 -10.16,1.27
3D body "PIN_mid.STEP": height 8.43, standoff -2.49, extent -15.24,-1.27 -12.7,1.27
3D body "PIN_mid.STEP": height 8.43, standoff -2.49, extent -17.78,-1.27 -15.24,1.27
3D body "PIN_mid.STEP": height 8.43, standoff -2.49, extent -20.32,-1.27 -17.78,1.27
3D body "PIN_mid.STEP": height 8.43, standoff -2.49, extent -22.86,-1.27 -20.32,1.27
3D body "PIN_mid.STEP": height 8.43, standoff -2.49, extent -25.4,-1.27 -22.86,1.27
3D body "PIN_mid.STEP": height 8.43, standoff -2.49, extent -27.94,-1.27 -25.4,1.27
3D body "PIN_mid.STEP": height 8.43, standoff -2.49, extent -30.48,-1.27 -27.94,1.27
3D body "PIN_mid.STEP": height 8.43, standoff -2.49, extent -33.02,-1.27 -30.48,1.27
3D body "PIN_mid.STEP": height 8.43, standoff -2.49, extent -35.56,-1.27 -33.02,1.27
3D body "PIN_mid.STEP": height 8.43, standoff -2.49, extent -38.1,-1.27 -35.56,1.27
3D body "PIN_mid.STEP": height 8.43, standoff -2.49, extent -40.64,-1.27 -38.1,1.27
3D body "PIN_mid.STEP": height 8.43, standoff -2.49, extent -43.18,-1.27 -40.64,1.27
3D body "PIN.STEP": height 8.43, standoff -2.49, extent -45.72,-1.27 -43.18,1.27

## MHDR1X36-254P - E [mm] "Male Header 1X36 with 2.54 mm Pitch"
pads (36):
  rect 1.5x1.5 hole 0.9: 1(-44.45,0)
  round 1.5 hole 0.9: 2(-41.91,0) 3(-39.37,0) 4(-36.83,0) 5(-34.29,0) 6(-31.75,0) 7(-29.21,0) 8(-26.67,0) 9(-24.13,0) 10(-21.59,0) 11(-19.05,0) 12(-16.51,0) 13(-13.97,0) 14(-11.43,0) 15(-8.89,0) 16(-6.35,0) 17(-3.81,0) 18(-1.27,0) 19(1.27,0) 20(3.81,0) 21(6.35,0) 22(8.89,0) 23(11.43,0) 24(13.97,0) 25(16.51,0) 26(19.05,0) 27(21.59,0) 28(24.13,0) 29(26.67,0) 30(29.21,0) 31(31.75,0) 32(34.29,0) 33(36.83,0) 34(39.37,0) 35(41.91,0) 36(44.45,0)
Top Overlay:
  drawing of 253 lines, arcs and shapes, not listed
3D body "PIN.STEP": height 8.43, standoff -2.49, extent 43.18,-1.27 45.72,1.27
3D body "PIN_mid.STEP": height 8.43, standoff -2.49, extent 40.64,-1.27 43.18,1.27
3D body "PIN_mid.STEP": height 8.43, standoff -2.49, extent 38.1,-1.27 40.64,1.27
3D body "PIN_mid.STEP": height 8.43, standoff -2.49, extent 35.56,-1.27 38.1,1.27
3D body "PIN_mid.STEP": height 8.43, standoff -2.49, extent 33.02,-1.27 35.56,1.27
3D body "PIN_mid.STEP": height 8.43, standoff -2.49, extent 30.48,-1.27 33.02,1.27
3D body "PIN_mid.STEP": height 8.43, standoff -2.49, extent 27.94,-1.27 30.48,1.27
3D body "PIN_mid.STEP": height 8.43, standoff -2.49, extent 25.4,-1.27 27.94,1.27
3D body "PIN_mid.STEP": height 8.43, standoff -2.49, extent 22.86,-1.27 25.4,1.27
3D body "PIN_mid.STEP": height 8.43, standoff -2.49, extent 20.32,-1.27 22.86,1.27
3D body "PIN_mid.STEP": height 8.43, standoff -2.49, extent 17.78,-1.27 20.32,1.27
3D body "PIN_mid.STEP": height 8.43, standoff -2.49, extent 15.24,-1.27 17.78,1.27
3D body "PIN_mid.STEP": height 8.43, standoff -2.49, extent 12.7,-1.27 15.24,1.27
3D body "PIN_mid.STEP": height 8.43, standoff -2.49, extent 10.16,-1.27 12.7,1.27
3D body "PIN_mid.STEP": height 8.43, standoff -2.49, extent 7.62,-1.27 10.16,1.27
3D body "PIN_mid.STEP": height 8.43, standoff -2.49, extent 5.08,-1.27 7.62,1.27
3D body "PIN_mid.STEP": height 8.43, standoff -2.49, extent 2.54,-1.27 5.08,1.27
3D body "PIN_mid.STEP": height 8.43, standoff -2.49, extent 0,-1.27 2.54,1.27
3D body "PIN_mid.STEP": height 8.43, standoff -2.49, extent -2.54,-1.27 0,1.27
3D body "PIN_mid.STEP": height 8.43, standoff -2.49, extent -5.08,-1.27 -2.54,1.27
3D body "PIN_mid.STEP": height 8.43, standoff -2.49, extent -7.62,-1.27 -5.08,1.27
3D body "PIN_mid.STEP": height 8.43, standoff -2.49, extent -10.16,-1.27 -7.62,1.27
3D body "PIN_mid.STEP": height 8.43, standoff -2.49, extent -12.7,-1.27 -10.16,1.27
3D body "PIN_mid.STEP": height 8.43, standoff -2.49, extent -15.24,-1.27 -12.7,1.27
3D body "PIN_mid.STEP": height 8.43, standoff -2.49, extent -17.78,-1.27 -15.24,1.27
3D body "PIN_mid.STEP": height 8.43, standoff -2.49, extent -20.32,-1.27 -17.78,1.27
3D body "PIN_mid.STEP": height 8.43, standoff -2.49, extent -22.86,-1.27 -20.32,1.27
3D body "PIN_mid.STEP": height 8.43, standoff -2.49, extent -25.4,-1.27 -22.86,1.27
3D body "PIN_mid.STEP": height 8.43, standoff -2.49, extent -27.94,-1.27 -25.4,1.27
3D body "PIN_mid.STEP": height 8.43, standoff -2.49, extent -30.48,-1.27 -27.94,1.27
3D body "PIN_mid.STEP": height 8.43, standoff -2.49, extent -33.02,-1.27 -30.48,1.27
3D body "PIN_mid.STEP": height 8.43, standoff -2.49, extent -35.56,-1.27 -33.02,1.27
3D body "PIN_mid.STEP": height 8.43, standoff -2.49, extent -38.1,-1.27 -35.56,1.27
3D body "PIN_mid.STEP": height 8.43, standoff -2.49, extent -40.64,-1.27 -38.1,1.27
3D body "PIN_mid.STEP": height 8.43, standoff -2.49, extent -43.18,-1.27 -40.64,1.27
3D body "PIN.STEP": height 8.43, standoff -2.49, extent -45.72,-1.27 -43.18,1.27

## MHDR1X38-254P [mm] "Male Header 1X38 with 2.54 mm Pitch"
pads (38):
  rect 1.5x1.5 hole 0.9: 1(-46.99,0)
  round 1.5 hole 0.9: 2(-44.45,0) 3(-41.91,0) 4(-39.37,0) 5(-36.83,0) 6(-34.29,0) 7(-31.75,0) 8(-29.21,0) 9(-26.67,0) 10(-24.13,0) 11(-21.59,0) 12(-19.05,0) 13(-16.51,0) 14(-13.97,0) 15(-11.43,0) 16(-8.89,0) 17(-6.35,0) 18(-3.81,0) 19(-1.27,0) 20(1.27,0) 21(3.81,0) 22(6.35,0) 23(8.89,0) 24(11.43,0) 25(13.97,0) 26(16.51,0) 27(19.05,0) 28(21.59,0) 29(24.13,0) 30(26.67,0) 31(29.21,0) 32(31.75,0) 33(34.29,0) 34(36.83,0) 35(39.37,0) 36(41.91,0) 37(44.45,0) 38(46.99,0)
Top Overlay:
  drawing of 267 lines, arcs and shapes, not listed
  text "38" at 47.498,-3.254 h1
  text "37" at 44.958,-3.254 h1
  text "36" at 42.418,-3.207 h1
  text "35" at 39.878,-3.254 h1
  text "34" at 37.338,-3.302 h1
  text "33" at 34.798,-3.254 h1
  text "32" at 32.258,-3.254 h1
  text "31" at 29.718,-2.826 h1
  text "30" at 27.178,-3.254 h1
  text "29" at 24.638,-3.207 h1
  text "28" at 22.098,-3.254 h1
  text "27" at 19.558,-3.254 h1
  text "26" at 17.018,-3.207 h1
  text "25" at 14.478,-3.254 h1
  text "24" at 11.938,-3.302 h1
  text "23" at 9.398,-3.254 h1
  text "22" at 6.858,-3.254 h1
  text "21" at 4.318,-2.826 h1
  text "20" at 1.778,-3.254 h1
  text "19" at -0.762,-3.05 h1
  text "18" at -3.302,-3.097 h1
  text "17" at -5.842,-3.097 h1
  text "16" at -8.382,-3.05 h1
  text "15" at -10.922,-3.097 h1
  text "14" at -13.462,-3.145 h1
  text "13" at -16.002,-3.097 h1
  text "12" at -18.542,-3.097 h1
  text "11" at -21.082,-2.669 h1
  text "10" at -23.622,-3.097 h1
  text "9" at -26.162,-2.317 h1
  text "8" at -28.702,-2.364 h1
  text "7" at -31.242,-2.364 h1
  text "6" at -33.782,-2.317 h1
  text "5" at -36.322,-2.364 h1
  text "4" at -38.862,-2.412 h1
  text "3" at -41.402,-2.364 h1
  text "2" at -43.942,-2.364 h1
  text "1" at -46.482,-1.936 h1
  text "1" at -46.482,-1.936 h1
3D body "PIN.STEP": height 8.43, standoff -2.49, extent 45.72,-1.27 48.26,1.27
3D body "PIN_mid.STEP": height 8.43, standoff -2.49, extent 43.18,-1.27 45.72,1.27
3D body "PIN_mid.STEP": height 8.43, standoff -2.49, extent 40.64,-1.27 43.18,1.27
3D body "PIN_mid.STEP": height 8.43, standoff -2.49, extent 38.1,-1.27 40.64,1.27
3D body "PIN_mid.STEP": height 8.43, standoff -2.49, extent 35.56,-1.27 38.1,1.27
3D body "PIN_mid.STEP": height 8.43, standoff -2.49, extent 33.02,-1.27 35.56,1.27
3D body "PIN_mid.STEP": height 8.43, standoff -2.49, extent 30.48,-1.27 33.02,1.27
3D body "PIN_mid.STEP": height 8.43, standoff -2.49, extent 27.94,-1.27 30.48,1.27
3D body "PIN_mid.STEP": height 8.43, standoff -2.49, extent 25.4,-1.27 27.94,1.27
3D body "PIN_mid.STEP": height 8.43, standoff -2.49, extent 22.86,-1.27 25.4,1.27
3D body "PIN_mid.STEP": height 8.43, standoff -2.49, extent 20.32,-1.27 22.86,1.27
3D body "PIN_mid.STEP": height 8.43, standoff -2.49, extent 17.78,-1.27 20.32,1.27
3D body "PIN_mid.STEP": height 8.43, standoff -2.49, extent 15.24,-1.27 17.78,1.27
3D body "PIN_mid.STEP": height 8.43, standoff -2.49, extent 12.7,-1.27 15.24,1.27
3D body "PIN_mid.STEP": height 8.43, standoff -2.49, extent 10.16,-1.27 12.7,1.27
3D body "PIN_mid.STEP": height 8.43, standoff -2.49, extent 7.62,-1.27 10.16,1.27
3D body "PIN_mid.STEP": height 8.43, standoff -2.49, extent 5.08,-1.27 7.62,1.27
3D body "PIN_mid.STEP": height 8.43, standoff -2.49, extent 2.54,-1.27 5.08,1.27
3D body "PIN_mid.STEP": height 8.43, standoff -2.49, extent 0,-1.27 2.54,1.27
3D body "PIN_mid.STEP": height 8.43, standoff -2.49, extent -2.54,-1.27 0,1.27
3D body "PIN_mid.STEP": height 8.43, standoff -2.49, extent -5.08,-1.27 -2.54,1.27
3D body "PIN_mid.STEP": height 8.43, standoff -2.49, extent -7.62,-1.27 -5.08,1.27
3D body "PIN_mid.STEP": height 8.43, standoff -2.49, extent -10.16,-1.27 -7.62,1.27
3D body "PIN_mid.STEP": height 8.43, standoff -2.49, extent -12.7,-1.27 -10.16,1.27
3D body "PIN_mid.STEP": height 8.43, standoff -2.49, extent -15.24,-1.27 -12.7,1.27
3D body "PIN_mid.STEP": height 8.43, standoff -2.49, extent -17.78,-1.27 -15.24,1.27
3D body "PIN_mid.STEP": height 8.43, standoff -2.49, extent -20.32,-1.27 -17.78,1.27
3D body "PIN_mid.STEP": height 8.43, standoff -2.49, extent -22.86,-1.27 -20.32,1.27
3D body "PIN_mid.STEP": height 8.43, standoff -2.49, extent -25.4,-1.27 -22.86,1.27
3D body "PIN_mid.STEP": height 8.43, standoff -2.49, extent -27.94,-1.27 -25.4,1.27
3D body "PIN_mid.STEP": height 8.43, standoff -2.49, extent -30.48,-1.27 -27.94,1.27
3D body "PIN_mid.STEP": height 8.43, standoff -2.49, extent -33.02,-1.27 -30.48,1.27
3D body "PIN_mid.STEP": height 8.43, standoff -2.49, extent -35.56,-1.27 -33.02,1.27
3D body "PIN_mid.STEP": height 8.43, standoff -2.49, extent -38.1,-1.27 -35.56,1.27
3D body "PIN_mid.STEP": height 8.43, standoff -2.49, extent -40.64,-1.27 -38.1,1.27
3D body "PIN_mid.STEP": height 8.43, standoff -2.49, extent -43.18,-1.27 -40.64,1.27
3D body "PIN_mid.STEP": height 8.43, standoff -2.49, extent -45.72,-1.27 -43.18,1.27
3D body "PIN.STEP": height 8.43, standoff -2.49, extent -48.26,-1.27 -45.72,1.27